# Altium footprint library ExtendBoard.PcbLib: 105 footprints (part 3 of 7)
Each footprint in its own frame and in the unit in brackets; x right, y up, seen from the top. Pads: shape width x height; smd on the part's side, far side on the other; paste and mask are expansions set on the pad; w line width, h text height; cw(c..) or ccw(c..) is an arc to the next point about the centre after c.
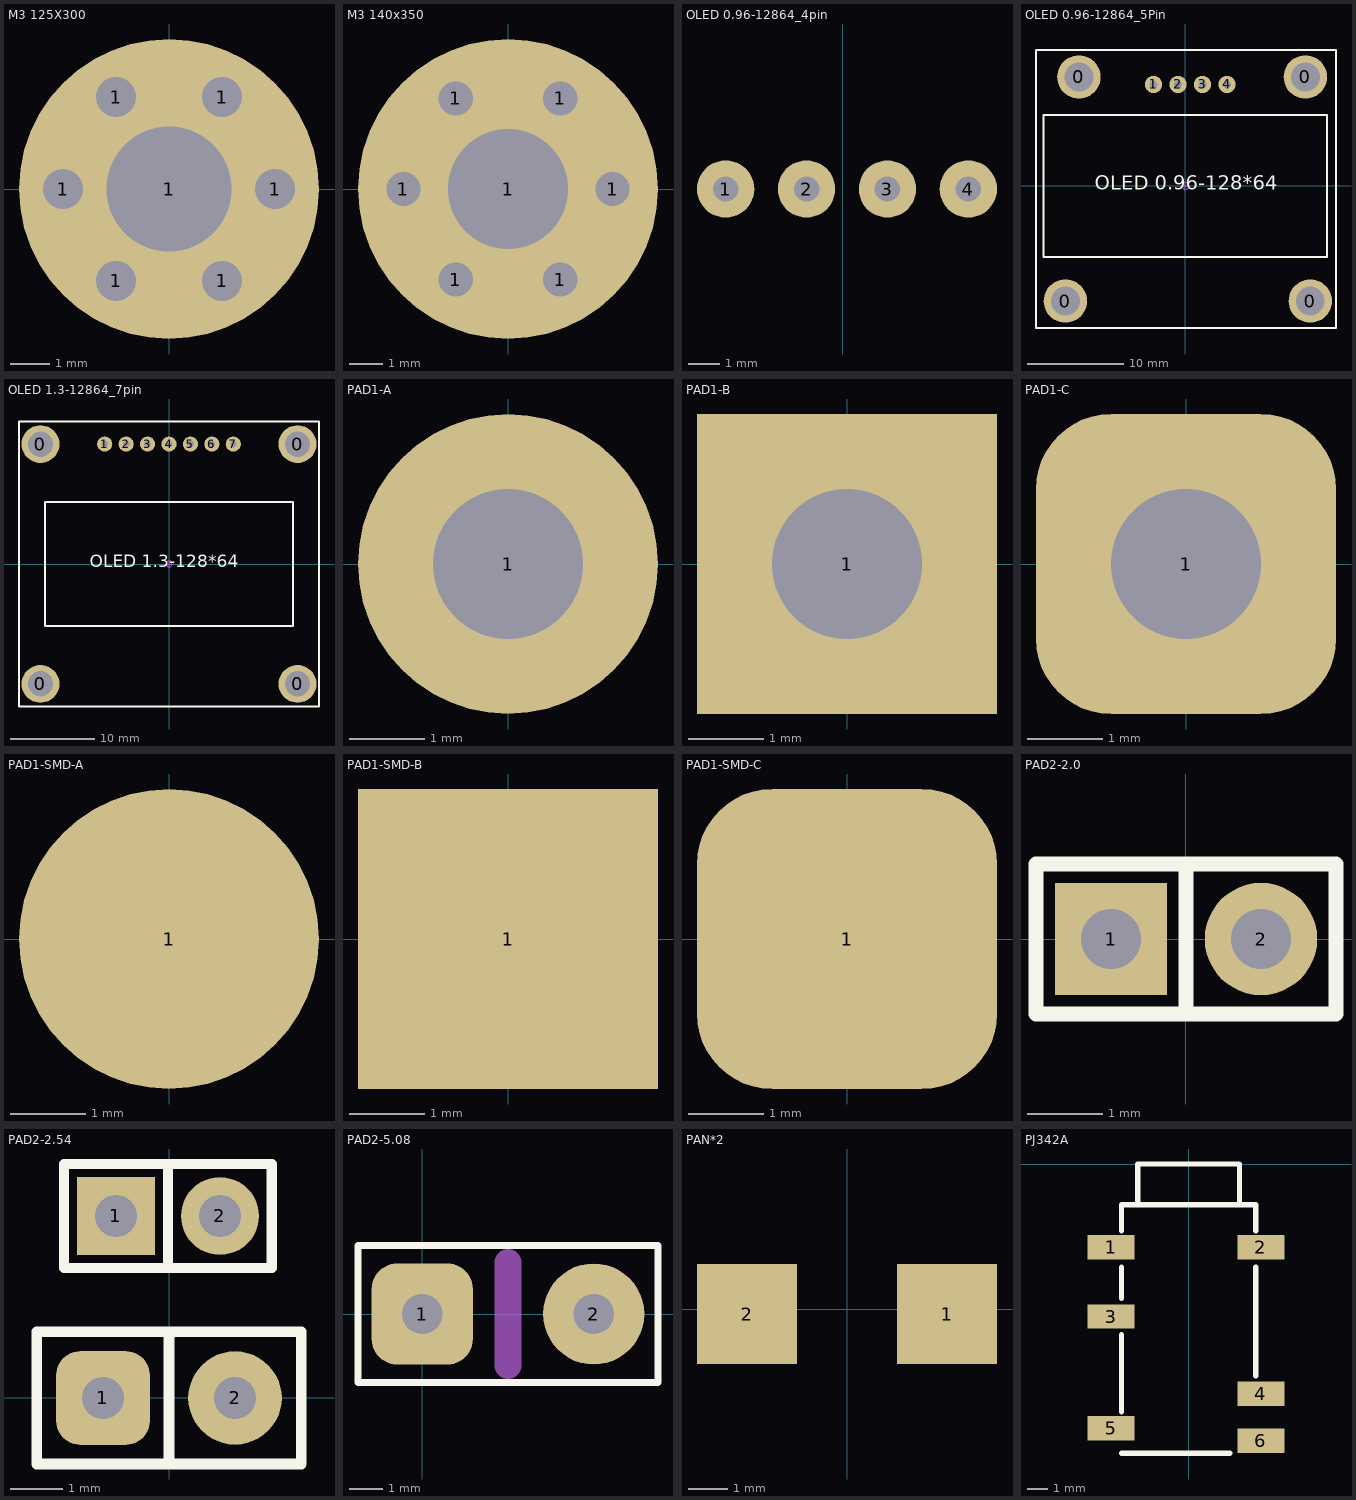
[diagram p2: the footprints below, top view; thin cyan lines are the x and y axes]

## M3 125X300 [mil] "M3螺丝孔，孔125Mil，焊盘300Mil"
pads (7):
  round 40 hole 40: 1(-106,0) 1(-53,-91.8) 1(-53,91.8) 1(53,-91.8) 1(53,91.8) 1(106,0)
  round 300 hole 125: 1(0,0)

## M3 140x350 [mil] "M3螺丝孔，孔140Mil，焊盘350Mil"
pads (7):
  round 35 hole 40: 1(-122,0) 1(-61,-105.66) 1(-61,105.66) 1(61,-105.66) 1(61,105.66) 1(122,0)
  round 350 hole 140: 1(0,0)

## OLED 0.96-12864_4pin [mm]
pads (4):
  round 1.8 hole 0.8: 1(-3.683,14.21) 2(-1.143,14.21) 3(1.397,14.21) 4(3.937,14.21)

## OLED 0.96-12864_5Pin [mm] "长：35.4mm，宽：33.5mm，"
pads (8):
  round 4.5 hole 3: 0(-12.446,-11.938) 0(-11.049,11.303) 0(12.446,11.303) 0(12.954,-11.938)
  round 1.8 hole 0.8: 1(-3.302,10.527) 2(-0.762,10.527) 3(1.778,10.527) 4(4.318,10.527)
Top Overlay:
  lines w0.2: -15.494,-14.732 15.621,-14.732 15.621,14.097 -15.494,14.097 -15.494,-14.732 ; -14.7,-7.35 -14.7,7.35 14.7,7.35 14.7,-7.35 -14.7,-7.35
  text "OLED 0.96-128*64" at -9.398,-0.889 h2.54
Mechanical 15:
  circle w0.05: c0,0 r0.35
  lines w0.05: -0.5,0 0.5,0 ; 0,-0.5 0,0.5

## OLED 1.3-12864_7pin [mm] "长：35.4mm，宽：33.5mm，"
pads (11):
  round 4.5 hole 3: 0(-15.24,-14.21) 0(-15.24,14.21) 0(15.24,-14.21) 0(15.24,14.21)
  round 1.8 hole 0.8: 1(-7.62,14.21) 2(-5.08,14.21) 3(-2.54,14.21) 4(0,14.21) 5(2.54,14.21) 6(5.08,14.21) 7(7.62,14.21)
Top Overlay:
  lines w0.2: -17.78,-16.891 -17.78,16.891 17.78,16.891 17.78,-16.891 -17.78,-16.891 ; -14.7,-7.35 14.7,-7.35 14.7,7.35 -14.7,7.35 -14.7,-7.35
  text "OLED 1.3-128*64" at -9.398,-0.889 h2.54
Mechanical 15:
  circle w0.05: c0,0 r0.35
  lines w0.05: -0.5,0 0.5,0 ; 0,-0.5 0,0.5
3D body "OLED 1.3-12864_7pin.STEP": height 5.5, standoff -6.02, extent -17.7,-16.75 17.7,16.75

## PAD1-A [mm] "引线焊盘"
pads (1):
  round 4 hole 2: 1(0,0)

## PAD1-B [mm] "引线焊盘"
pads (1):
  rect 4x4 hole 2: 1(0,0)

## PAD1-C [mm] "引线焊盘"
pads (1):
  rrect50% 4x4 hole 2: 1(0,0)

## PAD1-SMD-A [mm] "引线焊盘"
pads (1):
  round 4 smd: 1(0,0)

## PAD1-SMD-B [mm] "引线焊盘"
pads (1):
  rect 4x4 smd: 1(0,0)

## PAD1-SMD-C [mm] "引线焊盘"
pads (1):
  rrect50% 4x4 smd: 1(0,0)

## PAD2-2.0 [mm] "引线焊盘"
pads (2):
  rect 1.5x1.5 hole 0.8: 1(-1,0)
  round 1.5 hole 0.8: 2(1,0)
Top Overlay:
  lines w0.2: 0,-1 0,1 ; -2,-1 2,-1 2,1 -2,1 -2,-1

## PAD2-2.54 [mm] "引线焊盘"
pads (4):
  rrect50% 1.8x1.8 hole 0.8: 1(-1.27,0)
  rect 1.5x1.5 hole 0.8: 1(-1.02,3.5)
  round 1.5 hole 0.8: 2(0.98,3.5)
  round 1.8 hole 0.8: 2(1.27,0)
Top Overlay:
  lines w0.2: -0.02,2.5 -0.02,4.5 ; -2.02,2.5 1.98,2.5 1.98,4.5 -2.02,4.5 -2.02,2.5
  lines w0.203: 0,-1.27 0,1.27 ; -2.54,-1.27 -2.54,1.27 2.54,1.27 2.54,-1.27 -2.54,-1.27
3D body "HDR2.0-LI-2P.STEP": height 6.5, standoff -2.8, extent -2.02,2.5 1.98,4.5

## PAD2-5.08 [mm] "引线焊盘"
pads (2):
  rrect50% 3x3 hole 1.2: 1(0,0)
  round 3 hole 1.2: 2(5.08,0)
Top Overlay:
  lines w0.203: -1.905,-2.032 6.985,-2.032 6.985,2.032 -1.905,2.032 -1.905,-2.032
Mechanical 1:
  lines w0.8: 2.54,-1.524 2.54,1.524

## PAN*2 [mil]
pads (2):
  rect 100x100 smd: 1(100,-5) 2(-100,-5)

## PJ342A [mm] "有头"
pads (6):
  rect 2.3x1.2 smd: 1(-3.81,-4.1) 2(3.556,-4.1) 3(-3.81,-7.5) 4(3.556,-11.3) 5(-3.81,-13) 6(3.556,-13.6)
Top Overlay:
  lines w0.254: -3.302,-14.224 2.032,-14.224 ; -3.302,-12.192 -3.302,-8.382 ; -3.302,-6.604 -3.302,-5.08 ; -3.302,-3.302 -3.302,-2 3.302,-2 3.302,-3.302 ; -2.5,-2 -2.5,0 2.5,0 2.5,-2 ; 3.302,-10.414 3.302,-5.08
3D body "PJ342A.STEP": height 4.7, standoff -0.6, extent -4.15,-14.1 4.15,0